# Altium footprint library LDCN Components.PcbLib: 426 footprints (part 1 of 27)
Each footprint in its own frame and in the unit in brackets; x right, y up, seen from the top. Pads: shape width x height; smd on the part's side, far side on the other; paste and mask are expansions set on the pad; w line width, h text height; cw(c..) or ccw(c..) is an arc to the next point about the centre after c.
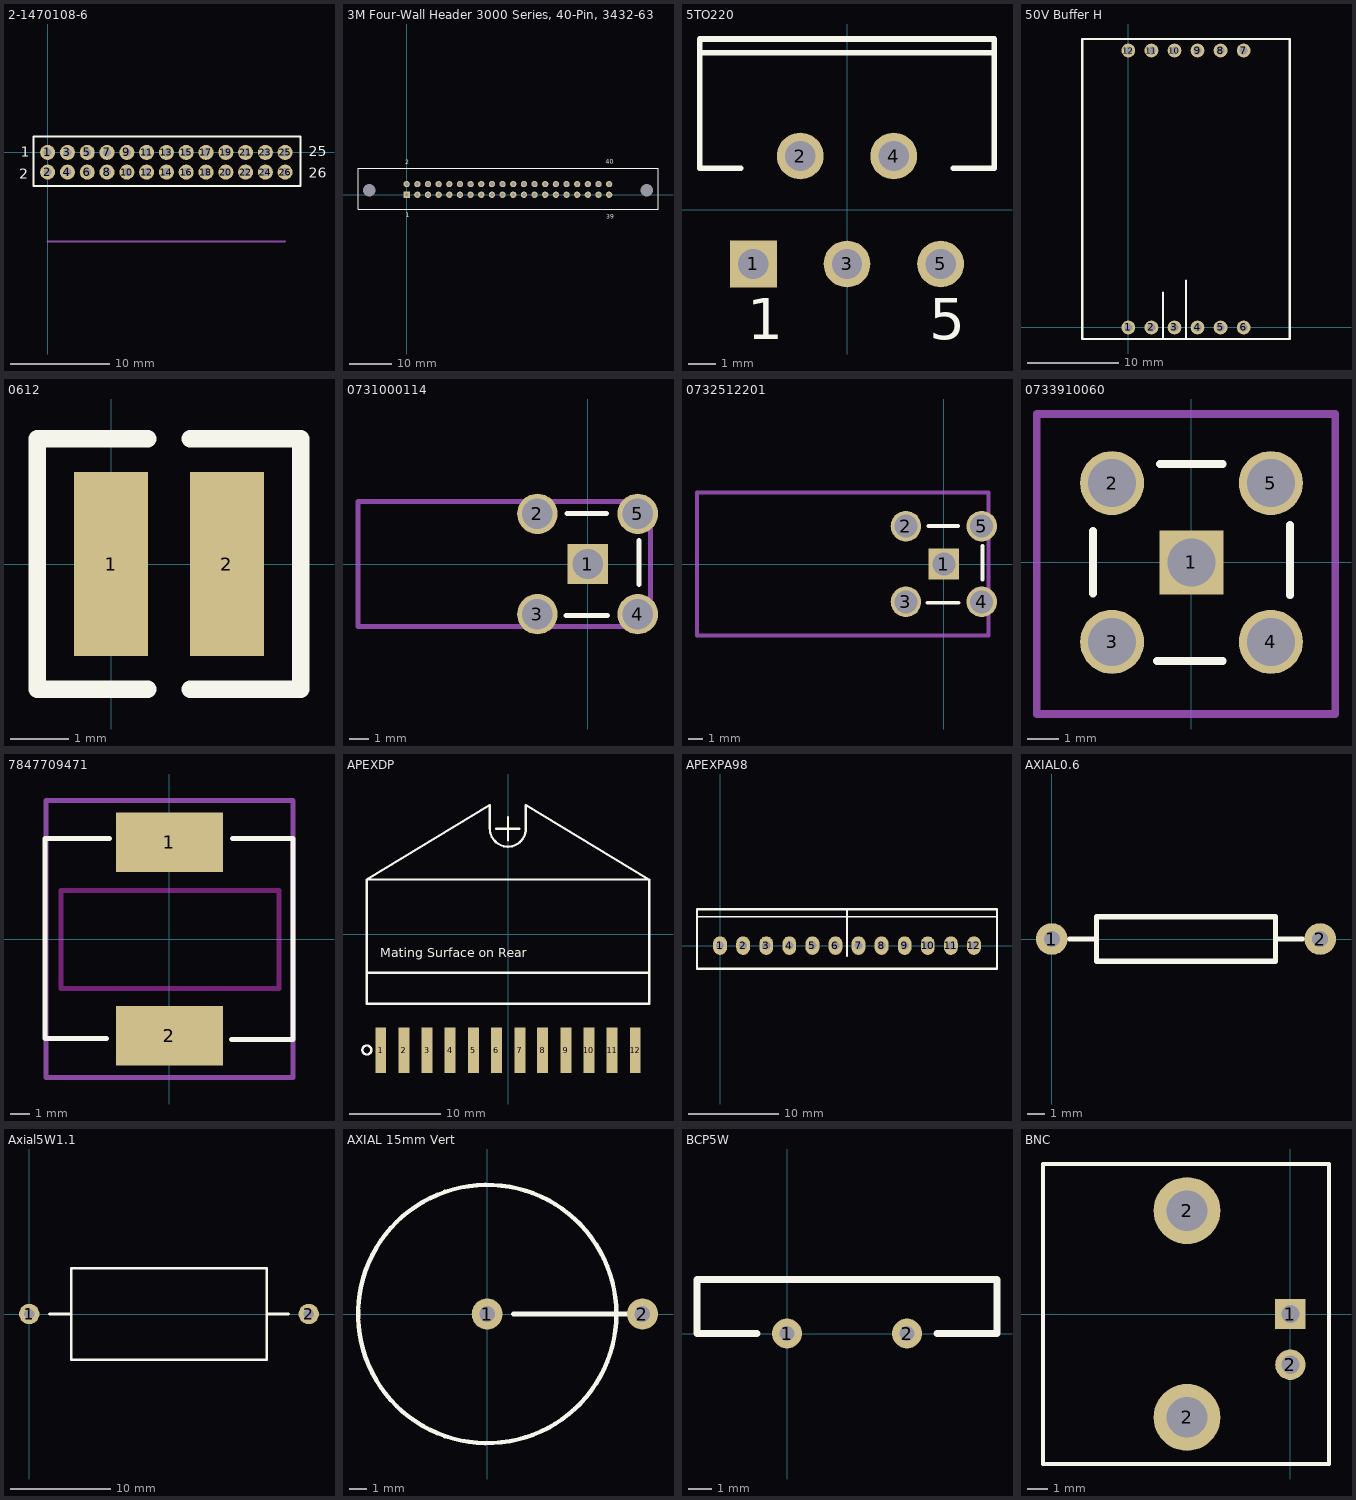
[diagram p0: the footprints below, top view; thin cyan lines are the x and y axes]

## 2-1470108-6 [mm] "CONN HEADER R/A 26POS 2MM"
height 2.3
pads (26):
  round 1.524 hole 0.8: 1(0,0) 2(0,-2) 3(2,0) 4(2,-2) 5(4,0) 6(4,-2) 7(6,0) 8(6,-2) 9(8,0) 10(8,-2) 11(10,0) 12(10,-2) 13(12,0) 14(12,-2) 15(14,0) 16(14,-2) 17(16,0) 18(16,-2) 19(18,0) 20(18,-2) 21(20,0) 22(20,-2) 23(22,0) 24(22,-2) 25(24,0) 26(24,-2)
Top Overlay:
  lines w0.2: -1.45,-3.4 25.55,-3.4 25.55,1.6 -1.45,1.6 -1.45,-3.4
  text "26" at 26.403,-2.547 h1.02
  text "25" at 26.403,-0.397 h1.02
  text "2" at -2.897,-2.647 h1.02
  text "1" at -2.697,-0.447 h1.02
Mechanical 1:
  lines w0.2: 0,-9 24,-9
  text "Board Edge" at 5.104,-7.588 h1.52

## 3M Four-Wall Header 3000 Series, 40-Pin, 3432-6302 [mm] "3M Four-Wall Header 3000 Series, 40-Pin, 3432-6302"
height 17.4
pads (42):
  round 0 hole 2.95: 0(-8.95,1.02) 0(57.21,1.02)
  rect 1.5x1.5 hole 0.9 square: 1(0,0)
  round 1.5 hole 0.9: 2(0,2.54) 3(2.54,0) 4(2.54,2.54) 5(5.08,0) 6(5.08,2.54) 7(7.62,0) 8(7.62,2.54) 9(10.16,0) 10(10.16,2.54) 11(12.7,0) 12(12.7,2.54) 13(15.24,0) 14(15.24,2.54) 15(17.78,0) 16(17.78,2.54) 17(20.32,0) 18(20.32,2.54) 19(22.86,0) 20(22.86,2.54) 21(25.4,0) 22(25.4,2.54) 23(27.94,0) 24(27.94,2.54) 25(30.48,0) 26(30.48,2.54) 27(33.02,0) 28(33.02,2.54) 29(35.56,0) 30(35.56,2.54) 31(38.1,0) 32(38.1,2.54) 33(40.64,0) 34(40.64,2.54) 35(43.18,0) 36(43.18,2.54) 37(45.72,0) 38(45.72,2.54) 39(48.26,0) 40(48.26,2.54)
Top Overlay:
  lines w0.254: -11.6,-3.45 59.9,-3.45 59.9,6.25 -11.6,6.25 -11.6,-3.45
  text "1" at -0.197,-5.347 h1.02
  text "2" at -0.347,7.253 h1.02
  text "39" at 47.553,-5.697 h1.02
  text "40" at 47.403,7.403 h1.02
3D body "3432-6302_step.stp": height 27.13, standoff -2.84, extent -10.989,-2.917 59.242,5.719

## 5TO220 [mm] "TO, Thru-Hole, Vertical, Heatsink Mounted; 5 Bent Staggered Leads; Pitch 1.7 mm"
height 21.1
pads (5):
  rect 1.7x1.7 hole 1.1: 1(-3.4,-1.96)
  round 1.7 hole 1.1: 2(-1.7,1.96) 3(0,-1.96) 4(1.7,1.96) 5(3.4,-1.96)
Top Overlay:
  lines w0.2: -5.35,5.71 5.35,5.71 ; -3.854,1.51 -5.35,1.51 -5.35,6.21 5.35,6.21 5.35,1.51 3.854,1.51
  text "5" at 2.98,-4.685 h1.5
  text "1" at -3.62,-4.685 h1.5

## 50V Buffer H [mil]
height 314.96
pads (12):
  round 60 hole 35: 1(0,0) 2(100,0) 3(200,0) 4(300,0) 5(400,0) 6(500,0) 7(500,1200) 8(400,1200) 9(300,1200) 10(200,1200) 11(100,1200) 12(0,1200)
Top Overlay:
  lines w10: 150,-50 150,150 ; 250,-50 250,203 ; -200,-50 -200,1250 700,1250 700,-50 -200,-50

## 0612 [mm]
pads (2):
  rect 1.27x3.175 smd: 1(0,0) 2(1.999,0)
Top Overlay:
  lines w0.305: 0.635,-2.159 -1.27,-2.159 -1.27,2.159 0.635,2.159 ; 1.364,-2.159 3.269,-2.159 3.269,2.159 1.364,2.159

## 0731000114 [mm] "SMA Connector Receptacle, Female Socket 50Ohm Through Hole, Right Angle Solder"
height 10.44
pads (5):
  rect 2.05x2.05 hole 1.54: 1(0,0)
  round 2.05 hole 1.54: 2(-2.54,2.54) 3(-2.54,-2.54) 4(2.54,-2.54) 5(2.54,2.54)
Top Overlay:
  lines w0.254: -1.1,-2.6 1,-2.6 ; -1.05,2.55 0.95,2.55 ; 2.6,-1.05 2.6,1.2
Mechanical 1:
  lines w0.254: -11.625,-3.175 3.175,-3.175 3.175,3.175 -11.625,3.175 -11.625,-3.175
3D body "731000114.stp": height 13.5, standoff 0, extent -11.625,-3.175 3.175,3.175

## 0732512201 [mm] "SMA Connector Jack, Female Socket 50Ohm Panel Mount, Through Hole, Right Angle Solder"
height 10.44
pads (5):
  rect 2.05x2.05 hole 1.54: 1(0,0)
  round 2.05 hole 1.54: 2(-2.54,2.54) 3(-2.54,-2.54) 4(2.54,-2.54) 5(2.54,2.54)
Top Overlay:
  lines w0.254: -1.1,-2.6 1,-2.6 ; -1.05,2.55 0.95,2.55 ; 2.6,-1.05 2.6,1.2
Mechanical 1:
  lines w0.254: -16.552,-4.8 2.998,-4.8 2.998,4.8 -16.552,4.8 -16.552,-4.8
3D body "732512201.stp": height 11.16, standoff -2.78, extent -16.552,-4.8 2.998,4.8

## 0733910060 [mm] "SMA Connector Receptacle, Female Socket 50Ohm Through Hole Solder"
height 13.5
pads (5):
  rect 2.05x2.05 hole 1.54: 1(0,0)
  round 2.05 hole 1.54: 2(-2.54,2.54) 3(-2.54,-2.54) 4(2.54,-2.54) 5(2.54,2.54)
Top Overlay:
  lines w0.254: -3.15,-1 -3.15,1 ; -1.1,-3.15 1,-3.15 ; -1,3.15 1,3.15 ; 3.15,-1.05 3.15,1.2
Mechanical 1:
  lines w0.254: -4.95,-4.85 4.6,-4.85 4.6,4.75 -4.95,4.75 -4.95,-4.85
3D body "733910060.stp": height 9.51, standoff -3.99, extent -3.134,-3.128 3.13,3.128

## 7847709471 [mm] "Würth Elektronik FIXED IND 470UH 900MA 490 MOHM"
height 10
pads (2):
  rect 5.4x3 smd: 1(0,4.9) 2(0,-4.9)
Top Overlay:
  lines w0.254: -3.2,-5.05 -6.3,-5.05 -6.3,-2.512 -6.3,2.562 -6.3,5.1 -3.05,5.1 ; 3.15,-5.1 6.25,-5.1 6.25,5.1 3.2,5.1
Keep-Out Layer:
  lines w0.254: -5.5,-2.5 5.55,-2.5 5.55,2.45 -5.5,2.45 -5.5,-2.5
Mechanical 1:
  lines w0.254: -6.25,-7.025 -6.25,7.025 6.25,7.025 6.25,-7.025 -6.25,-7.025
3D body "7847709010_Download_STP_WE-PDA-1210_rev1.stp": height 9.67, standoff 0.01, extent -5.85,-6 6.15,6

## APEXDP [mm]
pads (12):
  rect 1.2x5 smd: 1(-13.97,-12.7) 2(-11.43,-12.7) 3(-8.89,-12.7) 4(-6.35,-12.7) 5(-3.81,-12.7) 6(-1.27,-12.7) 7(1.3,-12.7) 8(3.81,-12.7) 9(6.35,-12.7) 10(8.89,-12.7) 11(11.43,-12.7) 12(13.97,-12.7)
Top Overlay:
  circle w0.254: c-15.5,-12.7 r0.5
  lines w0.254: -15.515,-4.23 -15.515,-7.62 15.485,-7.62 ; -1.3,11.61 1.27,11.61 ; 0,10.31 0,12.88 ; 15.47,6.03 1.965,14.18 1.965,11.61 cw(c-0.015,11.61) -1.995,11.61 -1.995,14.18 -15.5,6.03 ; 15.5,-7.62 15.5,-4.23 ; -15.5,6.03 -15.5,-4.23 15.5,-4.23 ; -15.5,6.03 15.5,6.03 15.5,-4.23
  text "Mating Surface on Rear" at -14,-2.54 h1

## APEXPA98 [mil]
pads (12):
  oval 60x80 hole 35: 1(0,0) 2(100,0) 3(200,0) 4(300,0) 5(400,0) 6(500,0) 7(600,0) 8(700,0) 9(800,0) 10(900,0) 11(1000,0) 12(1100,0)
Top Overlay:
  lines w7.87: -100,125 1200,125
  lines w10: -100,153 -100,-100 1200,-100 ; -100,157 1200,157 1200,-96 ; 550,-45 550,155

## AXIAL0.6 [mm]
pads (2):
  round 1.8 hole 0.914: 1(0,0) 2(15.24,0)
Top Overlay:
  lines w0.305: 1.016,0 2.54,0 ; 12.7,0 14.224,0 ; 2.54,-1.27 2.54,1.27 12.7,1.27 12.7,-1.27 2.54,-1.27

## Axial5W1.1 [mil]
pads (2):
  round 80 hole 40: 1(0,0) 2(1100,0)
Top Overlay:
  lines w10: 80,0 165,0 ; 935,0 1020,0 ; 165,0 165,-180 935,-180 935,180 165,180 165,0

## AXIAL 15mm Vert [mm] "Vertically mounted axial capacitor, 15mm diameter. 0.8mm Leads"
height 1.016
pads (2):
  round 1.8 hole 0.9: 1(0,0) 2(9.017,0)
Top Overlay:
  circle w0.254: c0,0 r7.5
  lines w0.305: 1.524,0 8.763,0

## BCP5W [mm] "BCP Series 5W Power Resistor"
pads (2):
  round 1.27 hole 0.635: 1(0,0) 2(5.08,0)
Top Overlay:
  lines w0.305: -1.27,0 -3.81,0 -3.81,2.286 8.89,2.286 8.89,0 6.35,0

## BNC [mm] "Connector; BNC Elbow"
pads (4):
  rect 1.5x1.5 hole 0.9: 1(0,0)
  round 3.3 hole 2: 2(-5.1,-5.1) 2(-5.1,5.1)
  round 1.5 hole 0.9: 2(0,-2.5)
Top Overlay:
  lines w0.025: -12.2,-7.4 -12.2,-6.25 -12.2,6.25 -12.2,7.4 1.9,7.4 1.9,-7.4 -12.2,-7.4
  lines w0.2: -12.2,-7.4 1.9,-7.4 1.9,7.4 -12.2,7.4 -12.2,6.25 -12.2,-6.25 -12.2,-7.4